# Altium footprint library Reflow3D1411sep.PcbLib: 657 footprints (part 5 of 42)
Each footprint in its own frame and in the unit in brackets; x right, y up, seen from the top. Pads: shape width x height; smd on the part's side, far side on the other; paste and mask are expansions set on the pad; w line width, h text height; cw(c..) or ccw(c..) is an arc to the next point about the centre after c.
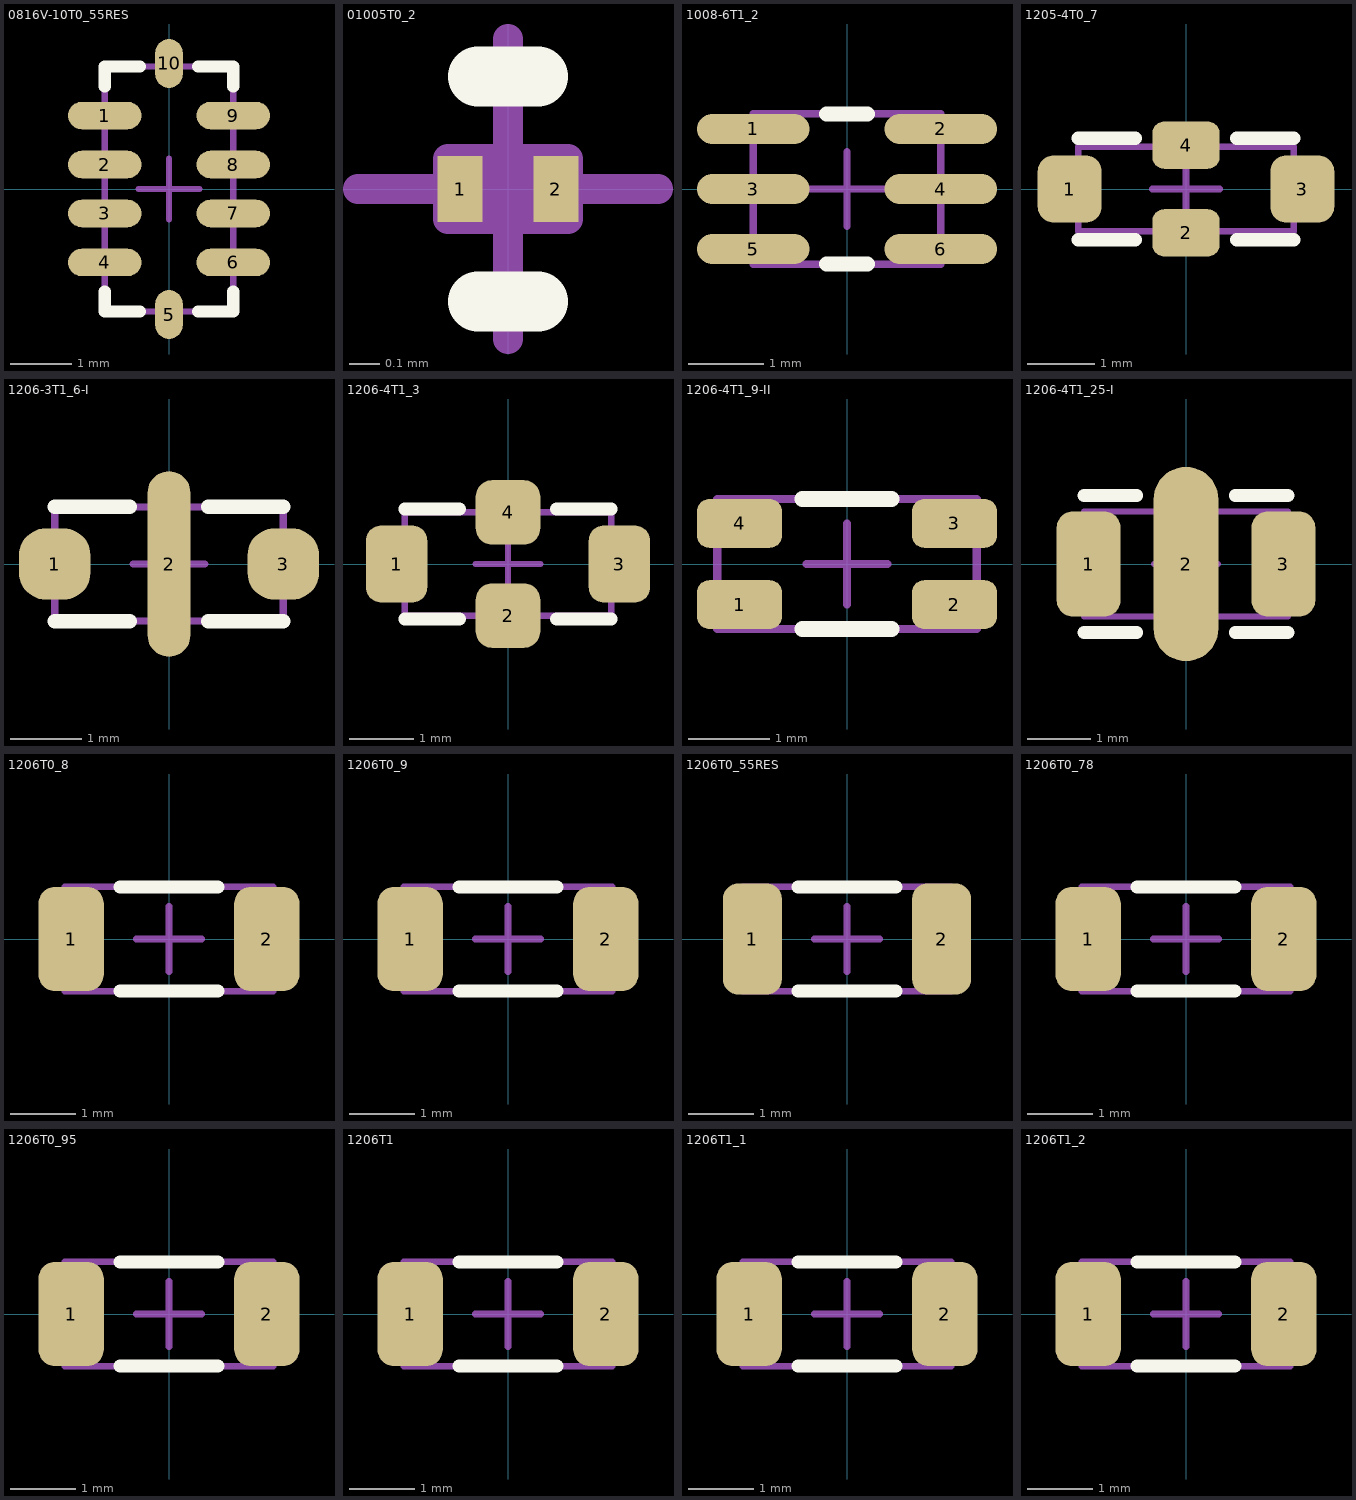
[diagram p4: the footprints below, top view; thin cyan lines are the x and y axes]

## 0816V-10T0_55RES [mm] "www.bourns.com, CAT25.pdf"
height 0.55
pads (10):
  oval 1.2x0.45 smd mask+0.075: 1(-1.05,1.2) 2(-1.05,0.4) 3(-1.05,-0.4) 4(-1.05,-1.2) 6(1.05,-1.2) 7(1.05,-0.4) 8(1.05,0.4) 9(1.05,1.2)
  oval 0.45x0.8 smd mask+0.075: 5(0,-2.05) 10(0,2.05)
Top Overlay:
  lines w0.2: -1.05,-1.675 -1.05,-2 -0.475,-2 ; -1.05,1.675 -1.05,2 -0.475,2 ; 0.475,-2 1.05,-2 1.05,-1.675 ; 0.475,2 1.05,2 1.05,1.675
Mechanical 13:
  lines w0.1: -1.05,-2 -1.05,2 1.05,2 1.05,-2 -1.05,-2
Mechanical 15:
  lines w0.1: -0.5,0 0.5,0 ; 0,-0.5 0,0.5
3D body: height 0.65, standoff 0, extent -1.15,-2.1 1.15,2.1

## 01005T0_2 [mm] "www.kyocera.com, cm-ce.pdf"
height 0.2
pads (2):
  rect 0.15x0.22 smd mask-25.4: 1(-0.16,0) 2(0.16,0)
Top Overlay:
  lines w0.2: -0.1,-0.375 0.1,-0.375 ; -0.1,0.375 0.1,0.375
Top Solder:
  region: -0.285,-0.16 0.285,-0.16 0.285,0.16 -0.285,0.16
Mechanical 13:
  lines w0.1: -0.2,-0.1 -0.2,0.1 0.2,0.1 0.2,-0.1 -0.2,-0.1
Mechanical 15:
  lines w0.1: -0.5,0 0.5,0 ; 0,-0.5 0,0.5
3D body: height 0.22, standoff 0, extent -0.21,-0.11 0.21,0.11

## 1008-6T1_2 [mm] "www.murata.com, c31e.pdf, DLM2HG"
height 1.2
pads (6):
  oval 1.5x0.4 smd mask+0.075: 1(-1.25,0.8) 2(1.25,0.8) 3(-1.25,0) 4(1.25,0) 5(-1.25,-0.8) 6(1.25,-0.8)
Top Overlay:
  lines w0.2: -0.275,-1 0.275,-1 ; -0.275,1 0.275,1
Mechanical 13:
  lines w0.1: -1.25,-1 1.25,-1 1.25,1 -1.25,1 -1.25,-1
Mechanical 15:
  lines w0.1: -0.5,0 0.5,0 ; 0,-0.5 0,0.5
3D body: height 1.4, standoff 0, extent -1.35,-1.1 1.35,1.1

## 1205-4T0_7 [mm] "www.murata.com, c31e.pdf, NFM3DP"
height 0.7
pads (4):
  rrect50% 0.95x1 smd paste-25.4 mask+0.075: 1(-1.725,0) 3(1.725,0)
  rrect50% 1x0.7 smd paste-25.4 mask+0.075: 2(0,-0.65) 4(0,0.65)
Top Overlay:
  lines w0.2: -1.6,-0.75 -0.75,-0.75 ; -1.6,0.75 -0.75,0.75 ; 0.75,-0.75 1.6,-0.75 ; 0.75,0.75 1.6,0.75
Top Paste:
  region: 0.5,-1 0.5,-0.3 -0.5,-0.3 -0.5,-1
  region: 0.5,0.3 0.5,1 -0.5,1 -0.5,0.3
  region: 1.95,-0.4 1.95,0.4 1.25,0.4 1.25,-0.4
  region: -1.25,-0.4 -1.25,0.4 -1.95,0.4 -1.95,-0.4
Mechanical 13:
  lines w0.1: -1.6,-0.625 1.6,-0.625 1.6,0.625 -1.6,0.625 -1.6,-0.625
Mechanical 15:
  lines w0.1: -0.5,0 0.5,0 ; 0,-0.5 0,0.5
3D body: height 0.9, standoff 0, extent -1.7,-0.725 1.7,0.725

## 1206-3T1_6-I [mm] "www.murata.com, c31e.pdf, NFE31P"
height 1.6
pads (3):
  rrect75% 1x1 smd paste-25.4 mask+0.075: 1(-1.6,0) 3(1.6,0)
  oval 0.6x2.6 smd paste-25.4 mask+0.075: 2(0,0)
Top Overlay:
  lines w0.2: -1.6,-0.8 -0.55,-0.8 ; -1.6,0.8 -0.55,0.8 ; 0.55,-0.8 1.6,-0.8 ; 0.55,0.8 1.6,0.8
Top Paste:
  region: 0.3,0.3 0.3,1.3 -0.3,1.3 -0.3,0.3
  region: 0.3,-1.3 0.3,-0.3 -0.3,-0.3 -0.3,-1.3
  region: 2.1,-0.5 2.1,0.5 1.1,0.5 1.1,-0.5
  region: -1.1,-0.5 -1.1,0.5 -2.1,0.5 -2.1,-0.5
Mechanical 13:
  lines w0.1: -1.6,-0.8 1.6,-0.8 1.6,0.8 -1.6,0.8 -1.6,-0.8
Mechanical 15:
  lines w0.1: -0.5,0 0.5,0 ; 0,-0.5 0,0.5
3D body: height 1.75, standoff 0, extent -1.775,-0.875 1.775,0.875

## 1206-4T1_3 [mm] "www.murata.com, c31e.pdf, NFM31P"
height 1.3
pads (4):
  rrect50% 0.95x1.2 smd mask+0.075: 1(-1.725,0) 3(1.725,0)
  rrect50% 1x1 smd mask+0.075: 2(0,-0.8) 4(0,0.8)
Top Overlay:
  lines w0.2: -1.6,-0.85 -0.75,-0.85 ; -1.6,0.85 -0.75,0.85 ; 0.75,-0.85 1.6,-0.85 ; 0.75,0.85 1.6,0.85
Mechanical 13:
  lines w0.1: -1.6,-0.8 1.6,-0.8 1.6,0.8 -1.6,0.8 -1.6,-0.8
Mechanical 15:
  lines w0.1: -0.5,0 0.5,0 ; 0,-0.5 0,0.5
3D body: height 1.5, standoff 0, extent -1.7,-0.9 1.7,0.9

## 1206-4T1_9-II [mm] "www.murata.com, c31e.pdf, DLW31S"
height 1.9
pads (4):
  rrect50% 1.05x0.6 smd mask+0.075: 1(-1.325,-0.5) 2(1.325,-0.5) 3(1.325,0.5) 4(-1.325,0.5)
Top Overlay:
  lines w0.2: -0.55,-0.8 0.55,-0.8 ; -0.55,0.8 0.55,0.8
Mechanical 13:
  lines w0.1: -1.6,-0.8 -1.6,0.8 1.6,0.8 1.6,-0.8 -1.6,-0.8
Mechanical 15:
  lines w0.1: -0.5,0 0.5,0 ; 0,-0.5 0,0.5
3D body: height 2.1, standoff 0, extent -1.7,-0.9 1.7,0.9

## 1206-4T1_25-I [mm] "www.yageo.com, X2Y_series_13.pdf"
height 1.25
pads (3):
  rrect50% 1x1.65 smd mask+0.075: 1(-1.53,0) 3(1.53,0)
  oval 1.02x3.05 smd mask+0.075: 2(0,0)
Top Overlay:
  lines w0.2: -1.6,-1.075 -0.775,-1.075 ; -1.6,1.075 -0.775,1.075 ; 0.775,-1.075 1.6,-1.075 ; 0.775,1.075 1.6,1.075
Mechanical 13:
  lines w0.1: -1.6,-0.825 1.6,-0.825 1.6,0.825 -1.6,0.825 -1.6,-0.825
Mechanical 15:
  lines w0.1: -0.5,0 0.5,0 ; 0,-0.5 0,0.5
3D body: height 1.4, standoff 0, extent -1.7,-0.925 1.7,0.925

## 1206T0_8 [mm] "www.avx.com, smccp.pdf; www.kemet.com, F3102_C0G.pdf"
height 0.8
pads (2):
  rrect50% 1x1.6 smd mask+0.075: 1(-1.5,0) 2(1.5,0)
Top Overlay:
  lines w0.2: -0.75,-0.8 0.75,-0.8 ; -0.75,0.8 0.75,0.8
Mechanical 13:
  lines w0.1: -1.6,-0.8 -1.6,0.8 1.6,0.8 1.6,-0.8 -1.6,-0.8
Mechanical 15:
  lines w0.1: -0.5,0 0.5,0 ; 0,-0.5 0,0.5
3D body: height 0.9, standoff 0, extent -1.7,-0.9 1.7,0.9

## 1206T0_9 [mm] "www.avx.com, smccp.pdf; www.kemet.com, F3102_C0G.pdf"
height 0.9
pads (2):
  rrect50% 1x1.6 smd mask+0.075: 1(-1.5,0) 2(1.5,0)
Top Overlay:
  lines w0.2: -0.75,-0.8 0.75,-0.8 ; -0.75,0.8 0.75,0.8
Mechanical 13:
  lines w0.1: -1.6,-0.8 1.6,-0.8 1.6,0.8 -1.6,0.8 -1.6,-0.8
Mechanical 15:
  lines w0.1: -0.5,0 0.5,0 ; 0,-0.5 0,0.5
3D body: height 1, standoff 0, extent -1.7,-0.9 1.7,0.9

## 1206T0_55RES [mm] "www.vishay.com, dcrcwe3.pdf"
height 0.55
pads (2):
  rrect50% 0.9x1.7 smd mask+0.075: 1(-1.45,0) 2(1.45,0)
Top Overlay:
  lines w0.2: -0.75,-0.8 0.75,-0.8 ; -0.75,0.8 0.75,0.8
Mechanical 13:
  lines w0.1: -1.6,-0.8 1.6,-0.8 1.6,0.8 -1.6,0.8 -1.6,-0.8
Mechanical 15:
  lines w0.1: -0.5,0 0.5,0 ; 0,-0.5 0,0.5
3D body: height 0.6, standoff 0, extent -1.65,-0.875 1.65,0.875

## 1206T0_78 [mm] "www.avx.com, smccp.pdf; www.kemet.com, F3102_C0G.pdf"
height 0.78
pads (2):
  rrect50% 1x1.6 smd mask+0.075: 1(-1.5,0) 2(1.5,0)
Top Overlay:
  lines w0.2: -0.75,-0.8 0.75,-0.8 ; -0.75,0.8 0.75,0.8
Mechanical 13:
  lines w0.1: -1.6,-0.8 1.6,-0.8 1.6,0.8 -1.6,0.8 -1.6,-0.8
Mechanical 15:
  lines w0.1: -0.5,0 0.5,0 ; 0,-0.5 0,0.5
3D body: height 0.88, standoff 0, extent -1.7,-0.9 1.7,0.9

## 1206T0_95 [mm] "www.avx.com, smccp.pdf; www.kemet.com, F3102_C0G.pdf"
height 0.95
pads (2):
  rrect50% 1x1.6 smd mask+0.075: 1(-1.5,0) 2(1.5,0)
Top Overlay:
  lines w0.2: -0.75,-0.8 0.75,-0.8 ; -0.75,0.8 0.75,0.8
Mechanical 13:
  lines w0.1: -1.6,-0.8 1.6,-0.8 1.6,0.8 -1.6,0.8 -1.6,-0.8
Mechanical 15:
  lines w0.1: -0.5,0 0.5,0 ; 0,-0.5 0,0.5
3D body: height 1.05, standoff 0, extent -1.7,-0.9 1.7,0.9

## 1206T1 [mm] "www.avx.com, smccp.pdf; www.kemet.com, F3102_C0G.pdf"
height 1
pads (2):
  rrect50% 1x1.6 smd mask+0.075: 1(-1.5,0) 2(1.5,0)
Top Overlay:
  lines w0.2: -0.75,-0.8 0.75,-0.8 ; -0.75,0.8 0.75,0.8
Mechanical 13:
  lines w0.1: -1.6,-0.8 -1.6,0.8 1.6,0.8 1.6,-0.8 -1.6,-0.8
Mechanical 15:
  lines w0.1: -0.5,0 0.5,0 ; 0,-0.5 0,0.5
3D body: height 1.1, standoff 0, extent -1.7,-0.9 1.7,0.9

## 1206T1_1 [mm] "www.avx.com, smccp.pdf; www.kemet.com, F3102_C0G.pdf"
height 1.1
pads (2):
  rrect50% 1x1.6 smd mask+0.075: 1(-1.5,0) 2(1.5,0)
Top Overlay:
  lines w0.2: -0.75,-0.8 0.75,-0.8 ; -0.75,0.8 0.75,0.8
Mechanical 13:
  lines w0.1: -1.6,-0.8 -1.6,0.8 1.6,0.8 1.6,-0.8 -1.6,-0.8
Mechanical 15:
  lines w0.1: -0.5,0 0.5,0 ; 0,-0.5 0,0.5
3D body: height 1.2, standoff 0, extent -1.7,-0.9 1.7,0.9

## 1206T1_2 [mm] "www.avx.com, smccp.pdf; www.kemet.com, F3102_C0G.pdf"
height 1.2
pads (2):
  rrect50% 1x1.6 smd mask+0.075: 1(-1.5,0) 2(1.5,0)
Top Overlay:
  lines w0.2: -0.75,-0.8 0.75,-0.8 ; -0.75,0.8 0.75,0.8
Mechanical 13:
  lines w0.1: -1.6,-0.8 -1.6,0.8 1.6,0.8 1.6,-0.8 -1.6,-0.8
Mechanical 15:
  lines w0.1: -0.5,0 0.5,0 ; 0,-0.5 0,0.5
3D body: height 1.35, standoff 0, extent -1.7,-0.9 1.7,0.9